# Altium footprint library SPEC-A7.PcbLib: 80 footprints (part 3 of 5)
Each footprint in its own frame and in the unit in brackets; x right, y up, seen from the top. Pads: shape width x height; smd on the part's side, far side on the other; paste and mask are expansions set on the pad; w line width, h text height; cw(c..) or ccw(c..) is an arc to the next point about the centre after c.
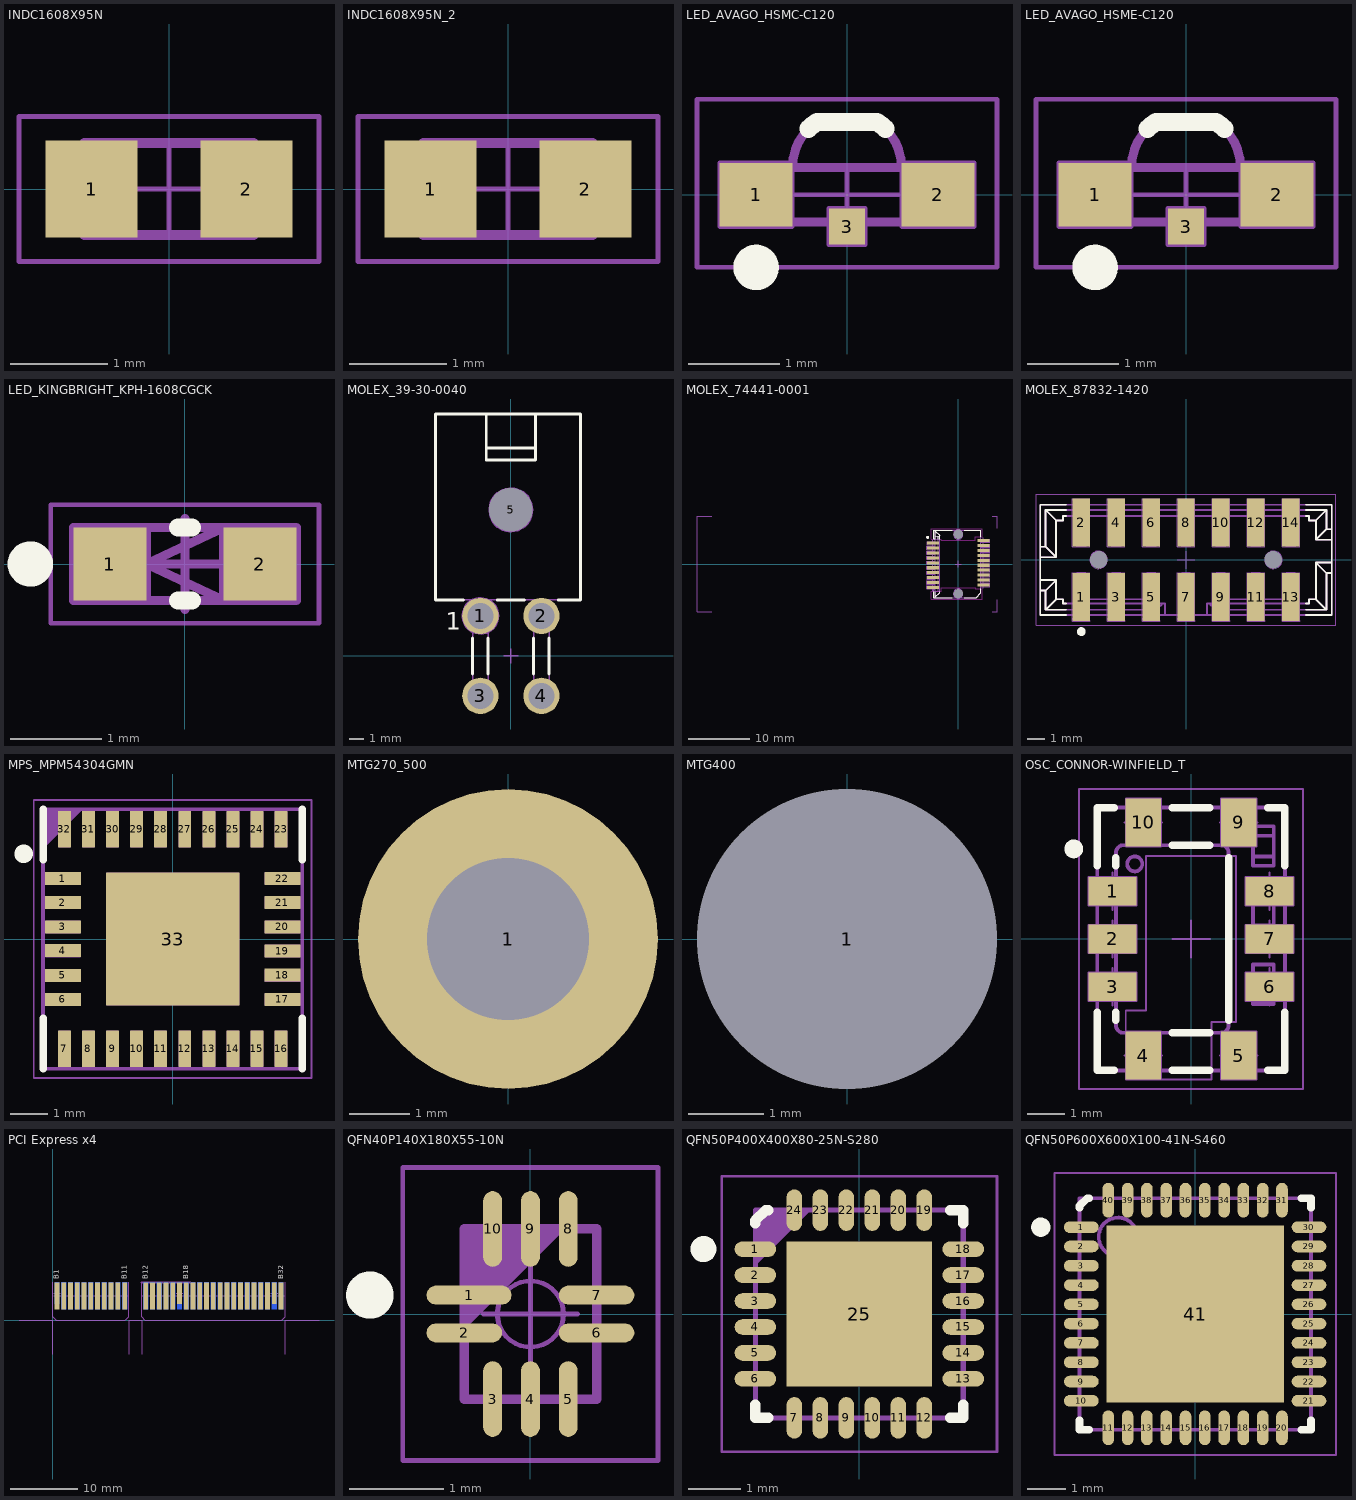
[diagram p2: the footprints below, top view; thin cyan lines are the x and y axes]

## INDC1608X95N [mm] "Chip Inductor, 2-Leads, EIA 0603, Metric 1608, Body 1.6x0.8mm, IPC Medium Density"
height 0.95
pads (2):
  rect 0.95x1 smd: 1(-0.8,0) 2(0.8,0)
Mechanical 14:
  lines w0.1: -0.875,-0.475 -0.875,0.475 0.875,0.475 0.875,-0.475 -0.875,-0.475
Mechanical 15:
  lines w0.05: -0.5,0 0.5,0 ; 0,-0.5 0,0.5 ; -1.55,-0.75 -1.55,0.75 1.55,0.75 1.55,-0.75 -1.55,-0.75
3D body "INDC1608X95N.stp": height 0.95, standoff -0.05, extent -0.875,-0.475 0.875,0.475

## INDC1608X95N_2 [mm]
pads (2):
  rect 0.95x1 smd: 1(-0.8,0) 2(0.8,0)
Mechanical 14:
  lines w0.1: -0.875,-0.475 -0.875,0.475 0.875,0.475 0.875,-0.475 -0.875,-0.475
Mechanical 15:
  lines w0.05: -0.5,0 0.5,0 ; 0,-0.5 0,0.5 ; -1.55,-0.75 -1.55,0.75 1.55,0.75 1.55,-0.75 -1.55,-0.75
3D body "INDC1608X95N.stp": height 0.95, standoff -0.05, extent -0.875,-0.475 0.875,0.475

## LED_AVAGO_HSMC-C120 [mm] "Red Chip LED, 2-Leads, Body 1.7x1.1mm, Side Emitting Package"
height 0.7
pads (3):
  rect 0.8x0.7 smd: 1(-1,0) 2(1,0)
  rect 0.4x0.4 smd: 3(0,-0.35)
Top Overlay:
  circle w0.25: c-1,-0.8 r0.125
  lines w0.2: -0.424,0.724 cw(c0,0.3) -0.332,0.8 0.332,0.8 cw(c0,0.3) 0.424,0.724
Mechanical 8:
  lines w0.05: -1,0 1,0 ; 0,-0.35 0,0 ; -1.4,-0.35 -0.6,-0.35 -0.6,0.35 -1.4,0.35 -1.4,-0.35 ; -0.2,-0.55 -0.2,-0.15 0.2,-0.15 0.2,-0.55 -0.2,-0.55 ; 0.6,-0.35 1.4,-0.35 1.4,0.35 0.6,0.35 0.6,-0.35
Mechanical 14:
  lines w0.1: -0.6,0.3 cw(c0,0.3) -0.332,0.8 0.332,0.8 cw(c0,0.3) 0.6,0.3 ; -0.85,-0.3 -0.85,0.3 0.85,0.3 0.85,-0.3 -0.85,-0.3
Mechanical 15:
  lines w0.05: -0.3,0 0.3,0 ; 0,-0.3 0,0.3 ; -1.65,-0.8 1.65,-0.8 1.65,1.05 -1.65,1.05 -1.65,-0.8
3D body "LED_AVAGO_HSMC-C120.stp": height 0.7, standoff 0, extent -0.85,-0.3 0.85,0.8

## LED_AVAGO_HSME-C120 [mm] "Green Chip LED, 2-Leads, Body 1.7x1.1mm, Side Emitting Package"
height 0.7
pads (3):
  rect 0.8x0.7 smd: 1(-1,0) 2(1,0)
  rect 0.4x0.4 smd: 3(0,-0.35)
Top Overlay:
  circle w0.25: c-1,-0.8 r0.125
  lines w0.2: -0.424,0.724 cw(c0,0.3) -0.332,0.8 0.332,0.8 cw(c0,0.3) 0.424,0.724
Mechanical 8:
  lines w0.05: -1,0 1,0 ; 0,-0.35 0,0 ; -1.4,-0.35 -0.6,-0.35 -0.6,0.35 -1.4,0.35 -1.4,-0.35 ; -0.2,-0.55 -0.2,-0.15 0.2,-0.15 0.2,-0.55 -0.2,-0.55 ; 0.6,-0.35 1.4,-0.35 1.4,0.35 0.6,0.35 0.6,-0.35
Mechanical 14:
  lines w0.1: -0.6,0.3 cw(c0,0.3) -0.332,0.8 0.332,0.8 cw(c0,0.3) 0.6,0.3 ; -0.85,-0.3 -0.85,0.3 0.85,0.3 0.85,-0.3 -0.85,-0.3
Mechanical 15:
  lines w0.05: -0.3,0 0.3,0 ; 0,-0.3 0,0.3 ; -1.65,-0.8 1.65,-0.8 1.65,1.05 -1.65,1.05 -1.65,-0.8
3D body "LED_AVAGO_HSME-C120.stp": height 0.7, standoff 0, extent -0.85,-0.3 0.85,0.8

## LED_KINGBRIGHT_KPH-1608CGCK [mm] "SMT Green LED, Case 0603, Body L 1.6 x W 0.8mm H 0.65mm"
height 0.65
pads (2):
  rect 0.8x0.8 smd: 1(-0.825,0) 2(0.825,0)
Top Overlay:
  circle w0.25: c-1.7,0 r0.125
  lines w0.2: -0.075,-0.4 0.075,-0.4 ; -0.075,0.4 0.075,0.4
Mechanical 8:
  lines w0.1: -0.5,0 0,0 ; -0.425,0 0.425,0 ; 0,-0.5 0,0 ; 0,0.5 0,0 ; 0.5,0 0,0 ; -0.425,-0.4 -1.225,-0.4 -1.225,0.4 -0.425,0.4 ; -0.425,-0.4 -0.425,0.4 ; -0.425,-0.4 -0.825,0 -0.425,0.4 ; 1.225,-0.4 0.425,-0.4 0.425,0.4 1.225,0.4 ; 1.225,-0.4 1.225,0.4 ; 1.225,-0.4 0.825,0 1.225,0.4
Mechanical 14:
  lines w0.1: -0.8,-0.4 -0.8,0.4 0.8,0.4 0.8,-0.4 -0.8,-0.4 ; -0.425,0 0.425,0.4 0.425,-0.4 -0.425,0
Mechanical 15:
  lines w0.05: -1.475,-0.65 -1.475,0.65 1.475,0.65 1.475,-0.65 -1.475,-0.65
3D body "LED_KINGBRIGHT_KPH-1608CGCK_Part1.stp": height 0.2, standoff 0, extent -0.8,-0.4 0.8,0.4
3D body "LED_KINGBRIGHT_KPH-1608CGCK_Part2.stp": height 0.65, standoff 0.12, extent -0.6,-0.4 0.6,0.4

## MOLEX_39-30-0040 [mm] "4.20mm (.165\") Pitch Mini-Fit Jr. Header, Dual Row, Right Angle with Snap-in Plastic Peg PCB Lock, 4 Circuits"
height 11.4
pads (5):
  round 2.5 hole 1.8: 1(-2.1,2.75) 2(2.1,2.75) 3(-2.1,-2.75) 4(2.1,-2.75)
  round 1 hole 3 unplated mask+1: 5(0,10.05)
Top Overlay:
  lines w0.2: -3.262,3.85 -5.2,3.85 -5.2,16.65 4.8,16.65 4.8,3.85 3.262,3.85 ; -2.635,-1.242 -2.635,1.242 ; -1.7,14.3 1.7,14.3 ; -1.7,16.65 -1.7,13.478 1.7,13.478 1.7,16.65 ; -1.565,-1.242 -1.565,1.242 ; -0.938,3.85 0.938,3.85 ; 1.565,-1.242 1.565,1.242 ; 2.635,-1.242 2.635,1.242
  text "1" at -4.475,1.8 h1.2
Mechanical 8:
  circle w0.1: c-2.1,2.75 r1.25
  circle w0.1: c-2.1,2.75 r0.9
  circle w0.1: c0,10.05 r1.5
  lines w0.1: -2.6,-2.75 -2.1,-2.75 ; -2.6,2.75 -2.1,2.75 ; -2.1,-3.25 -2.1,-2.75 ; -2.1,-2.25 -2.1,-2.75 ; -2.1,2.25 -2.1,2.75 ; -2.1,3.25 -2.1,2.75 ; -1.6,-2.75 -2.1,-2.75 ; -1.6,2.75 -2.1,2.75 ; -0.5,0 0,0 ; -0.5,10.05 0,10.05 ; 0,-0.5 0,0 ; 0,0.5 0,0 ; 0,9.55 0,10.05 ; 0,10.55 0,10.05 ; 0.5,0 0,0 ; 0.5,10.05 0,10.05 ; 1.6,-2.75 2.1,-2.75 ; 1.6,2.75 2.1,2.75 ; 2.1,-3.25 2.1,-2.75 ; 2.1,-2.25 2.1,-2.75 ; 2.1,2.25 2.1,2.75 ; 2.1,3.25 2.1,2.75 ; 2.6,-2.75 2.1,-2.75 ; 2.6,2.75 2.1,2.75
Mechanical 14:
  lines w0.1: -2.635,3.85 -2.635,-3.285 -1.565,-3.285 -1.565,3.85 ; -1.7,14.3 1.7,14.3 ; -1.7,16.65 -1.7,13.478 1.7,13.478 1.7,16.65 ; 1.565,3.85 1.565,-3.285 2.635,-3.285 2.635,3.85 ; -5.2,3.85 -5.2,16.65 4.8,16.65 4.8,3.85 -5.2,3.85
  text "1" at -4.475,1.8 h1.2
3D body "MOLEX_39-30-0040.stp": height 11.4, standoff -3.6, extent -5.2,-3.285 4.8,16.65

## MOLEX_74441-0001 [mm] "20 Position, Pitch 0.8mm SFP+ Receptacle (Small Form-factor Pluggable)"
height 5.4
pads (22):
  rect 2x0.5 smd: 1(-4.1,3.395) 2(-4.1,2.595) 3(-4.1,1.795) 4(-4.1,0.995) 5(-4.1,0.195) 6(-4.1,-0.605) 7(-4.1,-1.405) 8(-4.1,-2.205) 9(-4.1,-3.005) 10(-4.1,-3.805) 11(4.1,-3.405) 12(4.1,-2.605) 13(4.1,-1.805) 14(4.1,-1.005) 15(4.1,-0.205) 16(4.1,0.595) 17(4.1,1.395) 18(4.1,2.195) 19(4.1,2.995) 20(4.1,3.795)
  round 0.5 hole 1.55 unplated mask+0.525: MTG1(0,4.795) MTG2(0,-4.805)
Top Layer keep-out:
  lines w0.1: -4.34,-5.755 -4.34,-4.395 -2.78,-4.395 -2.78,-3.855 2.78,-3.855 2.78,-3.995 3.94,-3.995 3.94,-4.805 3.94,-5.755 -4.34,-5.755 ; -4.34,3.985 -4.34,5.745 3.94,5.745 3.94,4.385 2.78,4.385 2.78,3.845 -2.78,3.845 -2.78,3.985 -4.34,3.985
Top Overlay:
  circle w0.25: c-4.955,4.318 r0.125
  lines w0.2: -4,-4.505 -4,-5.505 -0.944,-5.505 ; -3.7,-5.505 -3.7,-4.505 ; -3.7,-5.305 -2.98,-4.705 -2.98,-4.505 ; -3.7,4.045 -3.7,5.495 ; -3.7,4.095 -4,4.095 -4,5.495 -0.944,5.495 ; -3.7,4.432 -2.98,4.495 ; -3.7,5.295 -2.98,4.695 -2.98,4.045 ; -3.223,4.045 -3.223,4.474 ; 0.944,-5.505 2.9,-5.505 3.7,-4.705 3.7,-4.055 ; 0.944,5.495 3.7,5.495 3.7,4.445
Mechanical 8:
  circle w0.1: c0,-4.805 r0.775
  circle w0.1: c0,4.795 r0.775
  lines w0.1: -40,-7.774 -42.4,-7.774 -42.4,7.774 -40,7.774 ; -4.6,-3.805 -4.1,-3.805 -3.6,-3.805 ; -4.6,-3.005 -4.1,-3.005 -3.6,-3.005 ; -4.6,-2.205 -4.1,-2.205 -3.6,-2.205 ; -4.6,-1.405 -4.1,-1.405 -3.6,-1.405 ; -4.6,-0.605 -4.1,-0.605 -3.6,-0.605 ; -4.6,0.195 -4.1,0.195 -3.6,0.195 ; -4.6,0.995 -4.1,0.995 -3.6,0.995 ; -4.6,1.795 -4.1,1.795 -3.6,1.795 ; -4.6,2.595 -4.1,2.595 -3.6,2.595 ; -4.6,3.395 -4.1,3.395 -3.6,3.395 ; -4.1,-4.305 -4.1,3.895 ; -0.5,-4.805 0,-4.805 ; -0.5,0 0,0 ; -0.5,4.795 0,4.795 ; 0,-5.305 0,-4.805 ; 0,-4.305 0,-4.805 ; 0,-0.5 0,0 ; 0,0.5 0,0 ; 0,4.295 0,4.795 ; 0,5.295 0,4.795 ; 0.5,-4.805 0,-4.805 ; 0.5,0 0,0 ; 0.5,4.795 0,4.795 ; 3.6,-3.405 4.1,-3.405 4.6,-3.405 ; 3.6,-2.605 4.1,-2.605 4.6,-2.605 ; 3.6,-1.805 4.1,-1.805 4.6,-1.805 ; 3.6,-1.005 4.1,-1.005 4.6,-1.005 ; 3.6,-0.205 4.1,-0.205 4.6,-0.205 ; 3.6,0.595 4.1,0.595 4.6,0.595 ; 3.6,1.395 4.1,1.395 4.6,1.395 ; 3.6,2.195 4.1,2.195 4.6,2.195 ; 3.6,2.995 4.1,2.995 4.6,2.995 ; 3.6,3.795 4.1,3.795 4.6,3.795 ; 4.1,-3.905 4.1,4.295 ; 5.5,-7.774 6.3,-7.774 6.3,-5.777 ; 5.5,7.774 6.3,7.774 6.3,5.777
Mechanical 14:
  circle w0.1: c-4.955,4.318 r0.125
  lines w0.1: -3.7,-5.505 -3.7,-4.105 ; -3.7,-5.305 -2.98,-4.705 -2.98,-4.505 ; -3.7,-4.442 -2.98,-4.505 ; -3.7,-4.055 -5.1,-4.055 -5.1,-3.555 -3.7,-3.555 ; -3.7,-3.255 -5.1,-3.255 -5.1,-2.755 -3.7,-2.755 ; -3.7,-2.455 -5.1,-2.455 -5.1,-1.955 -3.7,-1.955 ; -3.7,-1.655 -5.1,-1.655 -5.1,-1.155 -3.7,-1.155 ; -3.7,-0.855 -5.1,-0.855 -5.1,-0.355 -3.7,-0.355 ; -3.7,-0.055 -5.1,-0.055 -5.1,0.445 -3.7,0.445 ; -3.7,0.745 -5.1,0.745 -5.1,1.245 -3.7,1.245 ; -3.7,1.545 -5.1,1.545 -5.1,2.045 -3.7,2.045 ; -3.7,2.345 -5.1,2.345 -5.1,2.845 -3.7,2.845 ; -3.7,3.145 -5.1,3.145 -5.1,3.645 -3.7,3.645 ; -3.7,4.432 -2.98,4.495 ; -3.7,5.295 -2.985,4.695 -2.98,4.695 -2.98,4.495 ; -3.7,5.495 -3.7,4.095 ; -3.223,-4.484 -3.223,4.474 ; 3.7,-3.655 5.1,-3.655 5.1,-3.155 3.7,-3.155 ; 3.7,-2.855 5.1,-2.855 5.1,-2.355 3.7,-2.355 ; 3.7,-2.055 5.1,-2.055 5.1,-1.555 3.7,-1.555 ; 3.7,-1.255 5.1,-1.255 5.1,-0.755 3.7,-0.755 ; 3.7,-0.455 5.1,-0.455 5.1,0.045 3.7,0.045 ; 3.7,0.345 5.1,0.345 5.1,0.845 3.7,0.845 ; 3.7,1.145 5.1,1.145 5.1,1.645 3.7,1.645 ; 3.7,1.945 5.1,1.945 5.1,2.445 3.7,2.445 ; 3.7,2.745 5.1,2.745 5.1,3.245 3.7,3.245 ; 3.7,3.545 5.1,3.545 5.1,4.045 3.7,4.045 ; -3.7,-4.105 -3.7,4.095 ; -3.7,-4.105 -4,-4.105 -4,-5.505 2.9,-5.505 3.7,-4.705 3.7,5.495 -4,5.495 -4,4.095 -3.7,4.095 ; -2.98,-4.505 -2.98,4.495
3D body "MOLEX_74441-0001.stp": height 5.37, standoff -0.9, extent -4.54,-5.5 4.61,5.5

## MOLEX_87832-1420 [mm] "Milli-Grid, Pitch 2mm, 14 contacts, Surface Mount Vertical Header With Locking Window And Centre Polarization Slot"
height 6.4
pads (16):
  rect 1x2.75 smd: 1(-6,-2.125) 2(-6,2.125) 3(-4,-2.125) 4(-4,2.125) 5(-2,-2.125) 6(-2,2.125) 7(0,-2.125) 8(0,2.125) 9(2,-2.125) 10(2,2.125) 11(4,-2.125) 12(4,2.125) 13(6,-2.125) 14(6,2.125)
  round 0.5 hole 1 unplated mask+0.25: 15(-5,0) 16(5,0)
Top Overlay:
  circle w0.25: c-5.985,-4.1 r0.125
  lines w0.1: -8.325,-1.75 -8.025,-1.75 ; -8.325,-1.15 -7.425,-1.15 ; -8.325,0.15 -7.425,0.15 ; -8.325,0.75 -8.025,0.75 ; -6.85,-3.15 -8.325,-3.15 -8.325,3.15 -6.85,3.15 ; -6.85,-2.85 -8.025,-2.85 ; -6.85,-2.5 -7.025,-2.5 -7.025,-2.25 -7.425,-2.25 ; -6.85,2.5 -7.025,2.5 -7.025,2.25 -7.425,2.25 ; -6.85,2.85 -8.025,2.85 ; 6.85,-3.15 8.325,-3.15 8.325,3.15 6.85,3.15 ; 6.85,-2.85 8.025,-2.85 ; 6.85,-2.5 7.025,-2.5 7.025,-2.25 7.425,-2.25 ; 6.85,2.5 7.025,2.5 7.025,2.25 7.425,2.25 ; 6.85,2.85 8.025,2.85 ; 8.325,-0.75 8.025,-0.75 ; 8.325,-0.15 7.425,-0.15 ; 8.325,1.15 7.425,1.15 ; 8.325,1.75 8.025,1.75 ; -8.025,-2.85 -7.425,-2.25 ; -8.025,-2.85 -8.025,-1.75 ; -8.025,-1.75 -7.425,-1.15 ; -8.025,0.75 -8.025,2.85 ; -8.025,0.75 -7.425,0.15 ; -8.025,2.85 -7.425,2.25 ; -7.425,-2.25 -7.425,-1.15 ; -7.425,0.15 -7.425,2.25 ; 7.425,-2.25 7.425,-0.15 ; 7.425,-2.25 8.025,-2.85 ; 7.425,-0.15 8.025,-0.75 ; 7.425,1.15 7.425,2.25 ; 7.425,1.15 8.025,1.75 ; 7.425,2.25 8.025,2.85 ; 8.025,-2.85 8.025,-0.75 ; 8.025,1.75 8.025,2.85
Mechanical 8:
  circle w0.05: c-5,0 r0.5
  circle w0.05: c5,0 r0.5
  lines w0.05: -5.5,0 -5,0 ; -5,-0.5 -5,0 ; -5,0.5 -5,0 ; -4.5,0 -5,0 ; -0.5,0 0,0 ; 0,-0.5 0,0 ; 0,0.5 0,0 ; 0.5,0 0,0 ; 4.5,0 5,0 ; 5,-0.5 5,0 ; 5,0.5 5,0 ; 5.5,0 5,0 ; -6.5,-3.5 -6,-2.125 -5.5,-3.5 ; -6.5,-3.5 -6.5,-0.75 -5.5,-0.75 -5.5,-3.5 ; -6.5,-3.5 -5.5,-3.5 ; -6.5,3.5 -6,2.125 -5.5,3.5 ; -6.5,3.5 -5.5,3.5 ; -6.5,3.5 -6.5,0.75 -5.5,0.75 -5.5,3.5 ; -4.5,-3.5 -4,-2.125 -3.5,-3.5 ; -4.5,-3.5 -4.5,-0.75 -3.5,-0.75 -3.5,-3.5 ; -4.5,-3.5 -3.5,-3.5 ; -4.5,3.5 -4,2.125 -3.5,3.5 ; -4.5,3.5 -3.5,3.5 ; -4.5,3.5 -4.5,0.75 -3.5,0.75 -3.5,3.5 ; -2.5,-3.5 -2,-2.125 -1.5,-3.5 ; -2.5,-3.5 -2.5,-0.75 -1.5,-0.75 -1.5,-3.5 ; -2.5,-3.5 -1.5,-3.5 ; -2.5,3.5 -2,2.125 -1.5,3.5 ; -2.5,3.5 -1.5,3.5 ; -2.5,3.5 -2.5,0.75 -1.5,0.75 -1.5,3.5 ; -0.5,-3.5 0,-2.125 0.5,-3.5 ; -0.5,-3.5 -0.5,-0.75 0.5,-0.75 0.5,-3.5 ; -0.5,-3.5 0.5,-3.5 ; -0.5,3.5 0,2.125 0.5,3.5 ; -0.5,3.5 0.5,3.5 ; -0.5,3.5 -0.5,0.75 0.5,0.75 0.5,3.5 ; 1.5,-3.5 2,-2.125 2.5,-3.5 ; 1.5,-3.5 1.5,-0.75 2.5,-0.75 2.5,-3.5 ; 1.5,-3.5 2.5,-3.5 ; 1.5,3.5 2,2.125 2.5,3.5 ; 1.5,3.5 2.5,3.5 ; 1.5,3.5 1.5,0.75 2.5,0.75 2.5,3.5 ; 3.5,-3.5 4,-2.125 4.5,-3.5 ; 3.5,-3.5 3.5,-0.75 4.5,-0.75 4.5,-3.5 ; 3.5,-3.5 4.5,-3.5 ; 3.5,3.5 4,2.125 4.5,3.5 ; 3.5,3.5 4.5,3.5 ; 3.5,3.5 3.5,0.75 4.5,0.75 4.5,3.5 ; 5.5,-3.5 6,-2.125 6.5,-3.5 ; 5.5,-3.5 5.5,-0.75 6.5,-0.75 6.5,-3.5 ; 5.5,-3.5 6.5,-3.5 ; 5.5,3.5 6,2.125 6.5,3.5 ; 5.5,3.5 6.5,3.5 ; 5.5,3.5 5.5,0.75 6.5,0.75 6.5,3.5
Mechanical 14:
  drawing of 236 lines, arcs and shapes, not listed
Mechanical 15:
  lines w0.05: -8.575,-3.75 -8.575,3.75 8.575,3.75 8.575,-3.75 -8.575,-3.75
3D body "MOLEX_87832-1420.stp": height 7.6, standoff -0.75, extent -8.325,-3.15 8.325,3.15

## MPS_MPM54304GMN [mm] "MPS LGA-33 Case, 0.65mm Pitch, Rect. ; 32 Pin, 7.00mm L X 7.00mm W X 2.10mm H body (w/Thermal Tab 3.55 X 3.55mm)"
height 2.1
pads (33):
  rect 0.975x0.35 smd paste-2539.97 mask-0.025: 1(-2.963,1.633) 2(-2.963,0.983) 3(-2.963,0.325) 4(-2.963,-0.313) 5(-2.963,-0.983) 6(-2.963,-1.633) 17(2.963,-1.633) 18(2.963,-0.975) 19(2.963,-0.325) 20(2.963,0.325) 21(2.963,0.983) 22(2.963,1.633)
  rect 0.35x0.975 smd paste-2539.97 mask-0.025: 7(-2.925,-2.963) 8(-2.275,-2.963) 9(-1.625,-2.963) 10(-0.975,-2.963) 11(-0.325,-2.963) 12(0.325,-2.963) 13(0.975,-2.963) 14(1.625,-2.963) 15(2.275,-2.963) 16(2.925,-2.963) 23(2.925,2.963) 24(2.275,2.963) 25(1.625,2.963) 26(0.975,2.963) 27(0.325,2.963) 28(-0.325,2.963) 29(-0.975,2.963) 30(-1.625,2.963) 31(-2.275,2.963) 32(-2.925,2.963)
  rect 3.6x3.6 smd paste-2539.97 mask-0.25: 33(0,0)
Top Overlay:
  circle w0.25: c-4.025,2.3 r0.125
  lines w0.2: -3.5,-3.5 -3.5,-2.133 ; -3.5,2.133 -3.5,3.5 ; 3.5,-3.5 3.5,-2.133 ; 3.5,2.133 3.5,3.5
Top Paste:
  region: -1.775,-1.775 -1.775,1.775 1.775,1.775 1.775,-1.775
  region: 2.5,1.483 2.5,1.783 3.425,1.783 3.425,1.483
  region: 2.5,0.833 2.5,1.133 3.425,1.133 3.425,0.833
  region: 2.5,0.175 2.5,0.475 3.425,0.475 3.425,0.175
  region: 2.5,-0.475 2.5,-0.175 3.425,-0.175 3.425,-0.475
  region: 2.5,-1.125 2.5,-0.825 3.425,-0.825 3.425,-1.125
  region: 2.5,-1.783 2.5,-1.483 3.425,-1.483 3.425,-1.783
  region: -3.425,-1.133 -3.425,-0.833 -2.5,-0.833 -2.5,-1.133
  region: -3.425,-0.463 -3.425,-0.163 -2.5,-0.163 -2.5,-0.463
  region: -3.425,0.175 -3.425,0.475 -2.5,0.475 -2.5,0.175
  region: -3.425,0.833 -3.425,1.133 -2.5,1.133 -2.5,0.833
  region: -3.425,1.483 -3.425,1.783 -2.5,1.783 -2.5,1.483
  region: -3.425,-1.783 -3.425,-1.483 -2.5,-1.483 -2.5,-1.783
  region: -1.125,2.5 -1.125,3.425 -0.825,3.425 -0.825,2.5
  region: 2.775,2.5 2.775,3.425 3.075,3.425 3.075,2.5
  region: -0.475,2.5 -0.475,3.425 -0.175,3.425 -0.175,2.5
  region: 1.475,2.5 1.475,3.425 1.775,3.425 1.775,2.5
  region: 0.825,2.5 0.825,3.425 1.125,3.425 1.125,2.5
  region: 0.175,2.5 0.175,3.425 0.475,3.425 0.475,2.5
  region: -1.775,2.5 -1.775,3.425 -1.475,3.425 -1.475,2.5
  region: 2.125,2.5 2.125,3.425 2.425,3.425 2.425,2.5
  region: -2.425,2.5 -2.425,3.425 -2.125,3.425 -2.125,2.5
  region: -3.075,2.5 -3.075,3.425 -2.775,3.425 -2.775,2.5
  region: -0.475,-3.425 -0.475,-2.5 -0.175,-2.5 -0.175,-3.425
  region: 0.175,-3.425 0.175,-2.5 0.475,-2.5 0.475,-3.425
  region: -1.125,-3.425 -1.125,-2.5 -0.825,-2.5 -0.825,-3.425
  region: 1.475,-3.425 1.475,-2.5 1.775,-2.5 1.775,-3.425
  region: 0.825,-3.425 0.825,-2.5 1.125,-2.5 1.125,-3.425
  region: 2.125,-3.425 2.125,-2.5 2.425,-2.5 2.425,-3.425
  region: -1.775,-3.425 -1.775,-2.5 -1.475,-2.5 -1.475,-3.425
  region: 2.775,-3.425 2.775,-2.5 3.075,-2.5 3.075,-3.425
  region: -2.425,-3.425 -2.425,-2.5 -2.125,-2.5 -2.125,-3.425
  region: -3.075,-3.425 -3.075,-2.5 -2.775,-2.5 -2.775,-3.425
Mechanical 8:
  drawing of 200 lines, arcs and shapes, not listed
Mechanical 14:
  lines w0.1: -3.5,2.5 -2.5,3.5 ; -3.5,2.6 -2.6,3.5 ; -3.5,2.7 -2.7,3.5 ; -3.5,2.8 -2.8,3.5 ; -3.5,2.9 -2.9,3.5 ; -3.5,3 -3,3.5 ; -3.5,3.1 -3.1,3.5 ; -3.5,3.2 -3.2,3.5 ; -3.5,3.3 -3.3,3.5 ; -3.5,3.4 -3.4,3.5 ; -3.5,-3.5 3.5,-3.5 3.5,3.5 -3.5,3.5 -3.5,-3.5
Mechanical 15:
  lines w0.05: -3.75,-3.75 3.75,-3.75 3.75,3.75 -3.75,3.75 -3.75,-3.75
Drill Drawing:
  lines w0.1: -3.95,-3.95 3.95,-3.95 3.95,3.95 -3.95,3.95 -3.95,-3.95
  text "soldermask defined pads,  / do not increase/decrease  / soldermask aperture in this area" at -13.625,-10.641 h1.2
3D body "MPS_MPM54304GMN.stp": height 2.1, standoff 0, extent -3.5,-3.5 3.5,3.5

## MTG270_500 [mm] "Plated Through Hole: Hole Dia.=2.7mm Pad Dia.=5.0mm"
height 15
pads (1):
  round 5 hole 2.7: 1(0,0)

## MTG400 [mm] "Non Plated Through Hole: Hole Dia.=4mm"
height 15
pads (1):
  round 1 hole 4 unplated mask+1.5: 1(0,0)

## OSC_CONNOR-WINFIELD_T [mm] "SMD VCTCXO, Side Concave, 10 Pins, 5.00x7.00mm, T Series"
height 2
pads (10):
  rect 1.28x0.76 smd: 1(-2.09,1.27) 2(-2.09,0) 3(-2.09,-1.27) 6(2.09,-1.27) 7(2.09,0) 8(2.09,1.27)
  rect 0.94x1.28 smd: 4(-1.27,-3.105) 5(1.27,-3.105) 9(1.27,3.105) 10(-1.27,3.105)
Top Overlay:
  circle w0.25: c-3.125,2.4 r0.125
  lines w0.2: -2.5,-1.95 -2.5,-3.5 -2.04,-3.5 ; -2.5,1.95 -2.5,3.5 -2.04,3.5 ; -2,-2.165 -2,-1.95 ; -2,1.95 -2,2.165 ; -0.5,-3.5 0.5,-3.5 ; -0.5,-2.5 0.5,-2.5 ; -0.5,2.5 0.5,2.5 ; -0.5,3.5 0.5,3.5 ; 1,-2.165 1,2.165 ; 2.04,-3.5 2.5,-3.5 2.5,-1.95 ; 2.04,3.5 2.5,3.5 2.5,1.95
Mechanical 8:
  lines w0.05: -2.59,-1.27 -2.09,-1.27 ; -2.59,0 -2.09,0 ; -2.59,1.27 -2.09,1.27 ; -2.09,-1.77 -2.09,-1.27 ; -2.09,-0.77 -2.09,-1.27 ; -2.09,-0.5 -2.09,0 ; -2.09,0.5 -2.09,0 ; -2.09,0.77 -2.09,1.27 ; -2.09,1.77 -2.09,1.27 ; -1.77,-3.105 -1.27,-3.105 ; -1.77,3.105 -1.27,3.105 ; -1.59,-1.27 -2.09,-1.27 ; -1.59,0 -2.09,0 ; -1.59,1.27 -2.09,1.27 ; -1.27,-3.605 -1.27,-3.105 ; -1.27,-2.605 -1.27,-3.105 ; -1.27,2.605 -1.27,3.105 ; -1.27,3.605 -1.27,3.105 ; -0.77,-3.105 -1.27,-3.105 ; -0.77,3.105 -1.27,3.105 ; -0.5,0 0,0 ; 0,-0.5 0,0 ; 0,0.5 0,0 ; 0.5,0 0,0 ; 0.77,-3.105 1.27,-3.105 ; 0.77,3.105 1.27,3.105 ; 1.27,-3.605 1.27,-3.105 ; 1.27,-2.605 1.27,-3.105 ; 1.27,2.605 1.27,3.105 ; 1.27,3.605 1.27,3.105 ; 1.59,-1.27 2.09,-1.27 ; 1.59,0 2.09,0 ; 1.59,1.27 2.09,1.27 ; 1.77,-3.105 1.27,-3.105 ; 1.77,3.105 1.27,3.105 ; 2.09,-1.77 2.09,-1.27 ; 2.09,-0.77 2.09,-1.27 ; 2.09,-0.5 2.09,0 ; 2.09,0.5 2.09,0 ; 2.09,0.77 2.09,1.27 ; 2.09,1.77 2.09,1.27 ; 2.59,-1.27 2.09,-1.27 ; 2.59,0 2.09,0 ; 2.59,1.27 2.09,1.27 ; -1.74,-2.465 -1.74,-3.745 -0.8,-3.745 ; -1.74,-2.465 -1.74,-1.904 -1.196,-1.904 -1.196,2.211 1.196,2.211 1.196,-2.211 0.546,-2.211 0.546,-3.745 -0.8,-3.745 ; -1.74,-2.465 -0.8,-2.465 -0.8,-3.745 ; -2.73,-1.65 -1.45,-1.65 -1.45,-0.89 -2.73,-0.89 -2.73,-1.65 ; -2.73,-0.38 -1.45,-0.38 -1.45,0.38 -2.73,0.38 -2.73,-0.38 ; -2.73,0.89 -1.45,0.89 -1.45,1.65 -2.73,1.65 -2.73,0.89 ; -1.74,2.465 -0.8,2.465 -0.8,3.745 -1.74,3.745 -1.74,2.465 ; 0.8,-3.745 0.8,-2.465 1.74,-2.465 1.74,-3.745 0.8,-3.745 ; 0.8,2.465 1.74,2.465 1.74,3.745 0.8,3.745 0.8,2.465 ; 1.45,-1.65 1.45,-0.89 2.73,-0.89 2.73,-1.65 1.45,-1.65 ; 1.45,-0.38 1.45,0.38 2.73,0.38 2.73,-0.38 1.45,-0.38 ; 1.45,0.89 1.45,1.65 2.73,1.65 2.73,0.89 1.45,0.89
Mechanical 14:
  circle w0.1: c-1.5,2 r0.2
  lines w0.1: 1.556,-3.5 1.651,-3.5 ; 1.65,-1.48 2.2,-1.48 ; 1.65,-0.93 2.2,-0.93 ; 1.65,0.36 2.2,0.36 ; 1.65,0.91 2.2,0.91 ; 1.65,2.2 2.2,2.2 ; 1.651,2.75 2.2,2.75 ; 2.5,1.032 2.5,0.238 ccw(c2.5,0) 2.5,-0.238 2.5,-1.032 ccw(c2.5,-1.27) 2.5,-1.508 2.5,-3.5 1.581,-3.5 ccw(c1.27,-3.5) 0.959,-3.5 -0.959,-3.5 ccw(c-1.27,-3.5) -1.581,-3.5 -2.5,-3.5 -2.5,-1.508 ccw(c-2.5,-1.27) -2.5,-1.032 -2.5,-0.238 ccw(c-2.5,0) -2.5,0.238 -2.5,1.032 ccw(c-2.5,1.27) -2.5,1.508 -2.5,3.5 -1.581,3.5 ccw(c-1.27,3.5) -0.959,3.5 0.959,3.5 ccw(c1.27,3.5) 1.581,3.5 2.5,3.5 2.5,1.508 ccw(c2.5,1.27) 2.5,1.032 ; -2,-2.3 ccw(c-1.8,-2.3) -1.8,-2.5 0.8,-2.5 ccw(c0.8,-2.3) 1,-2.3 1,2.3 ccw(c0.8,2.3) 0.8,2.5 -1.8,2.5 ccw(c-1.8,2.3) -2,2.3 -2,-2.3 ; 1.65,-1.73 1.65,-0.68 2.2,-0.68 2.2,-1.73 1.65,-1.73 ; 1.65,0.11 1.65,1.16 2.2,1.16 2.2,0.11 1.65,0.11 ; 1.651,1.95 2.2,1.95 2.2,3 1.651,3 1.651,1.95
Mechanical 15:
  lines w0.05: -2.98,-3.995 -2.98,3.995 2.98,3.995 2.98,-3.995 -2.98,-3.995
3D body "OSC_CONNOR-WINFIELD_T.stp": height 2.4, standoff 0, extent -2.5,-3.5 2.5,3.5

## PCI Express x4 [mm] "64 contacts Board Eddge PCI Express x4 Connector"
pads (64):
  rect 0.7x3.2 smd far side paste-0.4: A1(0.6,4)
  rect 0.7x4 smd far side paste-0.4: A2(1.6,3.6) A3(2.6,3.6) A4(3.6,3.6) A5(4.6,3.6) A6(5.6,3.6) A7(6.6,3.6) A8(7.6,3.6) A9(8.6,3.6) A10(9.6,3.6) A11(10.6,3.6) A12(13.7,3.6) A13(14.7,3.6) A14(15.7,3.6) A15(16.7,3.6) A16(17.7,3.6) A17(18.7,3.6) A18(19.7,3.6) A19(20.7,3.6) A20(21.7,3.6) A21(22.7,3.6) A22(23.7,3.601) A23(24.7,3.601) A24(25.7,3.601) A25(26.7,3.601) A26(27.7,3.601) A27(28.7,3.601) A28(29.7,3.601) A29(30.7,3.602) A30(31.7,3.602) A31(32.7,3.602) A32(33.7,3.602)
  rect 0.7x4 smd paste-0.4: B1(0.6,3.6) B2(1.6,3.6) B3(2.6,3.6) B4(3.6,3.6) B5(4.6,3.6) B6(5.6,3.6) B7(6.6,3.6) B8(7.6,3.6) B9(8.6,3.6) B10(9.6,3.6) B11(10.6,3.6) B12(13.7,3.6) B13(14.7,3.6) B14(15.7,3.6) B15(16.7,3.6) B16(17.7,3.6) B18(19.7,3.6) B19(20.7,3.6) B20(21.7,3.6) B21(22.7,3.6) B22(23.7,3.601) B23(24.7,3.601) B24(25.7,3.601) B25(26.7,3.601) B26(27.7,3.601) B27(28.7,3.601) B28(29.7,3.601) B29(30.7,3.602) B30(31.7,3.602) B32(33.7,3.602)
  rect 0.7x3.2 smd paste-0.4: B17(18.7,4) B31(32.7,4.002)
Top Overlay:
  text "B1" at 0.889,6.096 h0.76
  text "B11" at 10.889,6.096 h0.76
  text "B12" at 13.989,6.096 h0.76
  text "B18" at 19.989,6.096 h0.76
  text "B32" at 33.989,6.098 h0.76
Bottom Overlay:
  text "A1" at 0.051,6.02 h0.76
  text "A11" at 10.051,6.02 h0.76
  text "A12" at 13.151,6.02 h0.76
  text "A18" at 19.151,6.02 h0.76
  text "A32" at 33.151,6.022 h0.76
Mechanical 8:
  drawing of 280 lines, arcs and shapes, not listed
Mechanical 15:
  lines w0.305: 13.1,5.6 20.3,5.6

## QFN40P140X180X55-10N [mm] "QFN, 0.40mm Pitch, Rect.;10 Pin, 1.80mm L X 1.40mm W X 0.55mm H Body, IPC Medium Density"
height 0.55
pads (10):
  oval 0.9x0.2 smd: 1(-0.65,0.2)
  oval 0.8x0.2 smd: 2(-0.7,-0.2) 6(0.7,-0.2) 7(0.7,0.2)
  oval 0.2x0.8 smd: 3(-0.4,-0.9) 4(0,-0.9) 5(0.4,-0.9) 8(0.4,0.9) 9(0,0.9) 10(-0.4,0.9)
Top Overlay:
  circle w0.25: c-1.7,0.2 r0.125
Mechanical 14:
  lines w0.1: -0.7,-0.1 0.3,0.9 ; -0.7,0 0.2,0.9 ; -0.7,0.1 0.1,0.9 ; -0.7,0.2 0,0.9 ; -0.7,0.3 -0.1,0.9 ; -0.7,0.4 -0.2,0.9 ; -0.7,0.5 -0.3,0.9 ; -0.7,0.6 -0.4,0.9 ; -0.7,0.7 -0.5,0.9 ; -0.7,0.8 -0.6,0.9 ; -0.7,-0.9 0.7,-0.9 0.7,0.9 -0.7,0.9 -0.7,-0.9
Mechanical 15:
  circle w0.05: c0,0 r0.35
  lines w0.05: -0.5,0 0.5,0 ; 0,-0.5 0,0.5 ; -1.35,-1.55 1.35,-1.55 1.35,1.55 -1.35,1.55 -1.35,-1.55
3D body "QFN40P140X180X55-10N.stp": height 0.55, standoff 0, extent -0.7,-0.9 0.7,0.9

## QFN50P400X400X80-25N-S280 [mm] "QFN,0.50mm Pitch, Square; 24 Pin, 4.00mm W X 4.00mm L X 0.80mm H body (w/Thermal Tab 2.80 X 2.80mm), IPC Medium Density"
height 0.8
pads (25):
  oval 0.8x0.3 smd: 1(-2,1.25) 2(-2,0.75) 3(-2,0.25) 4(-2,-0.25) 5(-2,-0.75) 6(-2,-1.25) 13(2,-1.25) 14(2,-0.75) 15(2,-0.25) 16(2,0.25) 17(2,0.75) 18(2,1.25)
  oval 0.3x0.8 smd: 7(-1.25,-2) 8(-0.75,-2) 9(-0.25,-2) 10(0.25,-2) 11(0.75,-2) 12(1.25,-2) 19(1.25,2) 20(0.75,2) 21(0.25,2) 22(-0.25,2) 23(-0.75,2) 24(-1.25,2)
  rect 2.8x2.8 smd: 25(0,0)
Top Overlay:
  circle w0.25: c-3,1.25 r0.125
  lines w0.2: -2,-1.75 -2,-2 -1.75,-2 ; -2,1.75 -2,1.8 -1.8,2 -1.75,2 ; 1.75,-2 2,-2 2,-1.75 ; 1.75,2 2,2 2,1.75
Mechanical 14:
  lines w0.1: -2,1 -1,2 ; -2,1.1 -1.1,2 ; -2,1.2 -1.2,2 ; -2,1.3 -1.3,2 ; -2,1.4 -1.4,2 ; -2,1.5 -1.5,2 ; -2,1.6 -1.6,2 ; -2,1.7 -1.7,2 ; -2,1.8 -1.8,2 ; -2,1.9 -1.9,2 ; -2,-2 2,-2 2,2 -2,2 -2,-2
Mechanical 15:
  circle w0.05: c0,0 r0.35
  lines w0.05: -0.5,0 0.5,0 ; 0,-0.5 0,0.5 ; -2.65,-2.65 2.65,-2.65 2.65,2.65 -2.65,2.65 -2.65,-2.65
3D body "QFN50P400X400X80-25N-S280.stp": height 0.8, standoff 0, extent -2.075,-2.075 2.075,2.075

## QFN50P600X600X100-41N-S460 [mm] "QFN, 0.50mm Pitch, Square 40 pin, 6.00mm L X 6.00mm W X 1.00mm H body (w/thermal tab 4.6mm x 4.6mm), IPC Medium Density"
height 1
pads (41):
  oval 0.9x0.3 smd: 1(-2.95,2.25) 2(-2.95,1.75) 3(-2.95,1.25) 4(-2.95,0.75) 5(-2.95,0.25) 6(-2.95,-0.25) 7(-2.95,-0.75) 8(-2.95,-1.25) 9(-2.95,-1.75) 10(-2.95,-2.25) 21(2.95,-2.25) 22(2.95,-1.75) 23(2.95,-1.25) 24(2.95,-0.75) 25(2.95,-0.25) 26(2.95,0.25) 27(2.95,0.75) 28(2.95,1.25) 29(2.95,1.75) 30(2.95,2.25)
  oval 0.3x0.9 smd: 11(-2.25,-2.95) 12(-1.75,-2.95) 13(-1.25,-2.95) 14(-0.75,-2.95) 15(-0.25,-2.95) 16(0.25,-2.95) 17(0.75,-2.95) 18(1.25,-2.95) 19(1.75,-2.95) 20(2.25,-2.95) 31(2.25,2.95) 32(1.75,2.95) 33(1.25,2.95) 34(0.75,2.95) 35(0.25,2.95) 36(-0.25,2.95) 37(-0.75,2.95) 38(-1.25,2.95) 39(-1.75,2.95) 40(-2.25,2.95)
  rect 4.6x4.6 smd: 41(0,0)
Top Overlay:
  circle w0.25: c-4,2.25 r0.125
  lines w0.2: -3,-2.75 -3,-3 -2.75,-3 ; -3,2.75 -3,2.8 -2.8,3 -2.75,3 ; 2.75,-3 3,-3 3,-2.75 ; 2.75,3 3,3 3,2.75
Top Paste:
  region: 0.28,0.28 0.28,1.74 1.74,1.74 1.74,0.28
  region: -1.74,0.28 -1.74,1.74 -0.28,1.74 -0.28,0.28
  region: 0.28,-1.74 0.28,-0.28 1.74,-0.28 1.74,-1.74
  region: -1.74,-1.74 -1.74,-0.28 -0.28,-0.28 -0.28,-1.74
Mechanical 14:
  circle w0.1: c-2,2 r0.5
  lines w0.1: -3,-3 3,-3 3,3 -3,3 -3,-3
Mechanical 15:
  circle w0.05: c0,0 r0.35
  lines w0.05: -0.5,0 0.5,0 ; 0,-0.5 0,0.5 ; -3.65,-3.65 3.65,-3.65 3.65,3.65 -3.65,3.65 -3.65,-3.65
3D body "QFN50P600X600X100-41N-S460.stp": height 1, standoff 0, extent -3,-3 3,3